# Altium footprint library OSHW_LuxonisMaster_20201223.PcbLib: 112 footprints (part 7 of 7)
Each footprint in its own frame and in the unit in brackets; x right, y up, seen from the top. Pads: shape width x height; smd on the part's side, far side on the other; paste and mask are expansions set on the pad; w line width, h text height; cw(c..) or ccw(c..) is an arc to the next point about the centre after c.
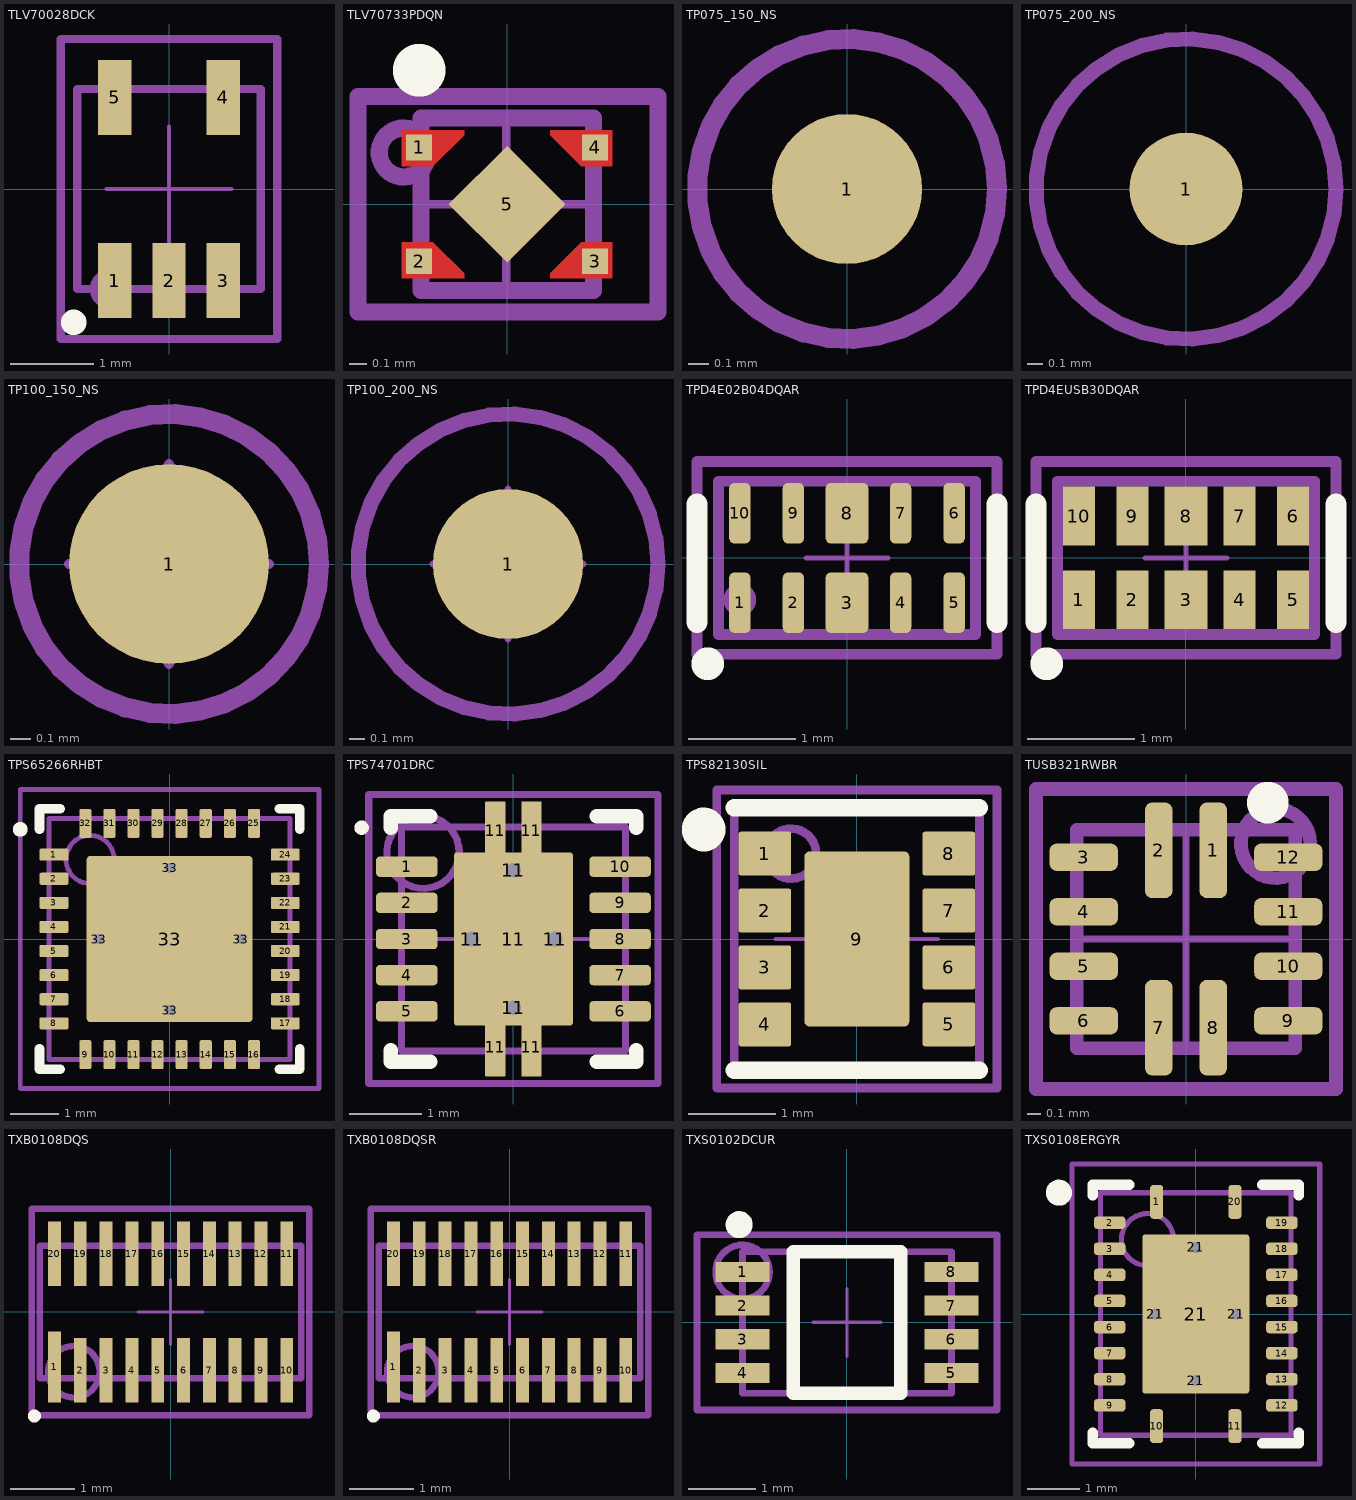
[diagram p6: the footprints below, top view; thin cyan lines are the x and y axes]

## TLV70028DCK [mm] "SC70-5 1.1mm"
height 1.1
pads (5):
  rect 0.4x0.9 smd paste-0.025 mask+0.05: 1(-0.65,-1.1) 2(0,-1.1) 3(0.65,-1.1) 4(0.65,1.1) 5(-0.65,1.1)
Top Overlay:
  circle w0.254: c-1.143,-1.6 r0.025
Top Assembly:
  circle w0.1: c-0.7,-1.2 r0.2
  lines w0.1: -1.3,-1.8 -1.3,1.8 1.3,1.8 1.3,-1.8 -1.3,-1.8
  text "'.Designator'" at 0,0 h1
Top Courtyard:
  lines w0.05: -0.75,0 0,0 ; 0,-0.75 0,0 ; 0,0.75 0,0 ; 0.75,0 0,0 ; -1.3,-1.8 1.3,-1.8 1.3,1.8 -1.3,1.8 -1.3,-1.8
Top Component Outline:
  lines w0.1: -1.1,-1.2 1.1,-1.2 1.1,1.2 -1.1,1.2 -1.1,-1.2
3D body "User Library-SOT353-1.step": height 1.1, standoff 0, extent -1.1,-1.2 1.1,1.2

## TLV70733PDQN [mm] "DFN, 4-Leads, Body 1.00x1.00mm, Pitch 0.65mm, IPC High Density"
height 0.4
pads (5):
  rect 0.15x0.15 smd mask+0: 1(-0.51,0.33) 2(-0.51,-0.33) 3(0.51,-0.33)
  rect 0.15x0.15 smd paste+0 mask+0: 4(0.51,0.33)
  rect 0.48x0.48 smd rot 45 mask+0.05: 5(0,0)
Top Layer:
  region: 0.036,0.777
  region: 0.25,0.43 0.61,0.43 0.61,0.22 0.43,0.22 0.25,0.4
  region: -0.25,-0.43 -0.61,-0.43 -0.61,-0.22 -0.43,-0.22 -0.25,-0.4
  region: -0.25,0.43 -0.61,0.43 -0.61,0.22 -0.43,0.22 -0.25,0.4
  region: 0.25,-0.43 0.61,-0.43 0.61,-0.22 0.43,-0.22 0.25,-0.4
Top Overlay:
  circle w0.254: c-0.51,0.777 r0.025
Top Paste:
  region: 0.25,0.43 0.61,0.43 0.61,0.22 0.43,0.22 0.25,0.4
  region: -0.25,-0.43 -0.61,-0.43 -0.61,-0.22 -0.43,-0.22 -0.25,-0.4
  region: -0.25,0.43 -0.61,0.43 -0.61,0.22 -0.43,0.22 -0.25,0.4
  region: 0.25,-0.43 0.61,-0.43 0.61,-0.22 0.43,-0.22 0.25,-0.4
Top Assembly:
  circle w0.1: c-0.6,0.3 r0.141
  lines w0.1: -0.865,-0.625 0.874,-0.625 0.874,0.625 -0.865,0.625 -0.865,-0.625
  text "'.Designator'" at 0,0 h1
Top Courtyard:
  lines w0.05: -0.505,0 0.495,0 ; -0.005,-0.5 -0.005,0.5 ; -0.865,-0.625 -0.865,0.625 0.874,0.625 0.874,-0.625 -0.865,-0.625
Top Component Outline:
  lines w0.1: -0.5,-0.5 -0.5,0.5 0.5,0.5 0.5,-0.5 -0.5,-0.5
3D body "DQN0004A.stp": height 0.34, standoff -0.02, extent -0.5,-0.5 0.5,0.5

## TP075_150_NS [mm] "0.75mm dia pad, 1.5mm dia clearance, no silk screen"
pads (1):
  round 0.75 smd paste-2: 1(0,0)
Top Assembly:
  circle w0.1: c0,0 r0.75
  text "'.Designator'" at 0,0 h0.75
Top Courtyard:
  circle w0.05: c0,0 r0.75

## TP075_200_NS [mm] "0.75mm dia pad, 2mm dia clearance, no silk screen"
pads (1):
  round 0.75 smd paste-2: 1(0,0)
Top Assembly:
  circle w0.1: c0,0 r1
  text "'.Designator'" at 0,0 h0.75
Top Courtyard:
  circle w0.05: c0,0 r1

## TP100_150_NS [mm] "1mm dia pad, 1.5mm clearance, no silk screen"
pads (1):
  round 1 smd paste-2: 1(0,0)
Top Assembly:
  circle w0.1: c0,0 r0.75
  text "'.Designator'" at 0,0 h0.75
Top Courtyard:
  circle w0.05: c0,0 r0.75
  lines w0.05: -0.5,0 0.5,0 ; 0,-0.5 0,0.5

## TP100_200_NS [mm] "1mm dia pad, 2mm dia clearance, no silk screen"
pads (1):
  round 1 smd paste-2: 1(0,0)
Top Assembly:
  circle w0.1: c0,0 r1
  text "'.Designator'" at 0,0 h0.75
Top Courtyard:
  circle w0.05: c0,0 r1
  lines w0.05: -0.5,0 0.5,0 ; 0,-0.5 0,0.5

## TPD4E02B04DQAR [mm] "TPD4E02B04DQAR"
height 0.55
pads (10):
  rrect50% 0.2x0.565 smd mask+0.07: 1(-1,-0.417) 2(-0.5,-0.417) 4(0.5,-0.417) 5(1,-0.417) 6(1,0.417) 7(0.5,0.417) 9(-0.5,0.417) 10(-1,0.417)
  rrect25% 0.4x0.565 smd mask+0.07: 3(0,-0.417) 8(0,0.417)
Top Overlay:
  circle w0.254: c-1.3,-0.988 r0.025
  lines w0.2: -1.4,-0.6 -1.4,0.5 ; 1.4,-0.6 1.4,0.5
Top Assembly:
  circle w0.254: c-1,-0.39 r0.025
  lines w0.1: -1.4,-0.9 -1.4,0.9 1.4,0.9 1.4,-0.9 -1.4,-0.9
  text "'.Designator'" at 0,0 h1
Top Courtyard:
  lines w0.05: -0.381,0 0.381,0 ; 0,-0.381 0,0.381 ; -1.4,-0.9 -1.4,0.9 1.4,0.9 1.4,-0.9 -1.4,-0.9
Top Component Outline:
  lines w0.1: -1.2,-0.715 -1.2,0.715 1.2,0.715 1.2,-0.715 -1.2,-0.715
3D body: height 0.55, standoff 0, extent -1.2,-0.715 1.2,0.715

## TPD4EUSB30DQAR [mm] "TPD4EUSB30DQAR"
height 0.55
pads (10):
  rect 0.3x0.55 smd mask+0.05: 1(-1,-0.39) 2(-0.5,-0.39) 4(0.5,-0.39) 5(1,-0.39) 6(1,0.39) 7(0.5,0.39) 9(-0.5,0.39) 10(-1,0.39)
  rect 0.4x0.55 smd mask+0.05: 3(0,-0.39) 8(0,0.39)
Top Overlay:
  circle w0.254: c-1.3,-0.988 r0.025
  lines w0.2: -1.4,-0.6 -1.4,0.5 ; 1.4,-0.6 1.4,0.5
Top Assembly:
  circle w0.254: c-1,-0.39 r0.025
  lines w0.1: -1.4,-0.9 1.4,-0.9 1.4,0.9 -1.4,0.9 -1.4,-0.9
  text "'.Designator'" at 0,0 h1
Top Courtyard:
  lines w0.05: -0.381,0 0.381,0 ; 0,-0.381 0,0.381 ; -1.4,-0.9 1.4,-0.9 1.4,0.9 -1.4,0.9 -1.4,-0.9
Top Component Outline:
  lines w0.1: -1.2,-0.715 1.2,-0.715 1.2,0.715 -1.2,0.715 -1.2,-0.715
3D body: height 0.55, standoff 0, extent -1.2,-0.715 1.2,0.715

## TPS65266RHBT [mm] "QFN, 32-Leads, Body 5.00x5.00mm, Pitch 0.50mm, Thermal Pad 3.45x3.45mm, IPC Medium Density"
height 1
pads (37):
  rrect25% 0.6x0.25 smd mask+0.07: 1(-2.4,1.75) 2(-2.4,1.25) 3(-2.4,0.75) 4(-2.4,0.25) 5(-2.4,-0.25) 6(-2.4,-0.75) 7(-2.4,-1.25) 8(-2.4,-1.75) 17(2.4,-1.75) 18(2.4,-1.25) 19(2.4,-0.75) 20(2.4,-0.25) 21(2.4,0.25) 22(2.4,0.75) 23(2.4,1.25) 24(2.4,1.75)
  rrect25% 0.25x0.6 smd mask+0.07: 9(-1.75,-2.4) 10(-1.25,-2.4) 11(-0.75,-2.4) 12(-0.25,-2.4) 13(0.25,-2.4) 14(0.75,-2.4) 15(1.25,-2.4) 16(1.75,-2.4) 25(1.75,2.4) 26(1.25,2.4) 27(0.75,2.4) 28(0.25,2.4) 29(-0.25,2.4) 30(-0.75,2.4) 31(-1.25,2.4) 32(-1.75,2.4)
  round 0.406 hole 0.203: 33(-1.475,0) 33(0,-1.475) 33(0,1.475) 33(1.475,0)
  rrect5% 3.45x3.45 smd paste-10 mask+0.07: 33(0,0)
Top Overlay:
  circle w0.254: c-3.1,2.275 r0.025
  lines w0.2: -2.7,-2.275 -2.7,-2.7 -2.275,-2.7 ; -2.7,2.275 -2.7,2.7 -2.275,2.7 ; 2.275,-2.7 2.7,-2.7 2.7,-2.275 ; 2.275,2.7 2.7,2.7 2.7,2.275
Top Paste:
  rectangle: 0.1,0.1 1.59,1.59
  rectangle: -1.59,0.1 -0.1,1.59
  rectangle: -1.59,-1.59 -0.1,-0.1
  rectangle: 0.1,-1.6 1.59,-0.11
Top Assembly:
  circle w0.1: c-1.65,1.65 r0.5
  lines w0.1: -3.1,-3.1 3.1,-3.1 3.1,3.1 -3.1,3.1 -3.1,-3.1
  text "'.Designator'" at 0,0 h1
Top Courtyard:
  lines w0.05: -0.5,0 0.5,0 ; 0,-0.5 0,0.5 ; -3.1,-3.1 -3.1,3.1 3.1,3.1 3.1,-3.1 -3.1,-3.1
Top Component Outline:
  lines w0.1: -2.5,-2.5 2.5,-2.5 2.5,2.5 -2.5,2.5 -2.5,-2.5
3D body "RHB0032E.stp": height 1, standoff 0, extent -2.5,-2.5 2.5,2.5

## TPS74701DRC [mm] "SON, 10-Leads, Body 3x3mm, Pitch 0.5mm, Thermal Pad 2.4x1.65mm, TI Recommended"
height 1
pads (19):
  rrect36% 0.85x0.28 smd paste-0.025 mask+0.07: 1(-1.475,1) 2(-1.475,0.5) 3(-1.475,0) 4(-1.475,-0.5) 5(-1.475,-1) 6(1.475,-1) 7(1.475,-0.5) 8(1.475,0) 9(1.475,0.5) 10(1.475,1)
  round 0.406 hole 0.203: 11(-0.575,0) 11(0,-0.95) 11(0,0.95) 11(0.575,0)
  rrect6% 0.28x0.8 smd paste-1 mask+0.07: 11(-0.25,-1.5) 11(-0.25,1.5) 11(0.25,-1.5) 11(0.25,1.5)
  rrect6% 1.65x2.4 smd paste-0.825 mask+0.07: 11(0,0)
Top Overlay:
  circle w0.1: c-2.1,1.54 r0.05
  lines w0.2: -1.7,-1.54 -1.7,-1.7 -1.15,-1.7 ; -1.7,1.54 -1.7,1.7 -1.15,1.7 ; 1.15,-1.7 1.7,-1.7 1.7,-1.54 ; 1.15,1.7 1.7,1.7 1.7,1.54
Top Paste:
  rectangle: -0.79,0.11 -0.11,1.16
  rectangle: -0.38,1.38 -0.12,1.88
  region: 0.38,1.88 0.12,1.88 0.12,1.38 0.38,1.38
  region: 0.38,-1.38 0.12,-1.38 0.12,-1.88 0.38,-1.88
  rectangle: -0.38,-1.88 -0.12,-1.38
  region: 0.79,1.16 0.11,1.16 0.11,0.11 0.79,0.11
  region: 0.79,-0.11 0.11,-0.11 0.11,-1.16 0.79,-1.16
  rectangle: -0.79,-1.16 -0.11,-0.11
Top Assembly:
  circle w0.1: c-1.25,1.2 r0.5
  lines w0.1: -2,-2 -2,2 2,2 2,-2 -2,-2
  text ".Designator" at 0,0 h0.64
Top Courtyard:
  lines w0.05: -1.05,0 1.05,0 ; 0,-1.05 0,1.05 ; -2,-2 2,-2 2,2 -2,2 -2,-2
Top Component Outline:
  lines w0.1: -1.55,-1.55 -1.55,1.55 1.55,1.55 1.55,-1.55 -1.55,-1.55
3D body: height 1, standoff 0, extent -1.55,-1.55 1.55,1.55

## TPS82130SIL [mm] "Non-Isolated PoL Module DC DC Converter 1 Output 0.9 ~ 5V    3A 3V - 17V Input"
height 1.53
pads (9):
  rrect10% 0.6x0.5 smd paste-0.05 mask-0.05: 1(-1.05,0.975) 2(-1.05,0.325) 3(-1.05,-0.325) 4(-1.05,-0.975) 5(1.05,-0.975) 6(1.05,-0.325) 7(1.05,0.325) 8(1.05,0.975)
  rrect10% 1.2x2 smd paste-2 mask-0.05: 9(0,0)
Top Overlay:
  circle w0.35: c-1.75,1.25 r0.075
  lines w0.2: -1.4,-1.5 1.4,-1.5 ; -1.4,1.5 1.4,1.5
Top Paste:
  region: 0.5,-0.825 0.5,-0.845 0.485,-0.882 0.457,-0.91 0.42,-0.925 0.4,-0.925 -0.4,-0.925 -0.42,-0.925 -0.457,-0.91 -0.485,-0.882 -0.5,-0.845 -0.5,-0.825 -0.5,-0.225 -0.5,-0.205 -0.485,-0.168 -0.457,-0.14 -0.42,-0.125 -0.4,-0.125 0.4,-0.125 0.42,-0.125 0.457,-0.14 0.485,-0.168 0.5,-0.205 0.5,-0.225
  region: -0.5,0.825 -0.5,0.845 -0.485,0.882 -0.457,0.91 -0.42,0.925 -0.4,0.925 0.4,0.925 0.42,0.925 0.457,0.91 0.485,0.882 0.5,0.845 0.5,0.825 0.5,0.225 0.5,0.205 0.485,0.168 0.457,0.14 0.42,0.125 0.4,0.125 -0.4,0.125 -0.42,0.125 -0.457,0.14 -0.485,0.168 -0.5,0.205 -0.5,0.225
Top Assembly:
  circle w0.1: c-0.75,0.975 r0.285
  lines w0.1: -1.6,-1.7 1.6,-1.7 1.6,1.7 -1.6,1.7 -1.6,-1.7
  text "'.Designator'" at 0,0.188 h1
Top Courtyard:
  lines w0.05: -0.925,0 0,0 ; 0,-0.925 0,0 ; 0,0.925 0,0 ; 0.925,0 0,0 ; -1.6,-1.7 -1.6,1.7 1.6,1.7 1.6,-1.7 -1.6,-1.7
Top Component Outline:
  lines w0.1: -1.4,-1.5 1.4,-1.5 1.4,1.5 -1.4,1.5 -1.4,-1.5
3D body "TPS82130SILR--3DModel-STEP-56544.STEP": height 1.55, standoff 0.02, extent -1.4,-1.5 1.4,1.5

## TUSB321RWBR [mm] "X2QFN-12 1.6x1.6"
height 0.4
pads (12):
  rrect50% 0.2x0.7 smd mask+0.05: 1(0.2,0.65) 2(-0.2,0.65) 7(-0.2,-0.65) 8(0.2,-0.65)
  rrect50% 0.5x0.2 smd mask+0.05: 3(-0.75,0.6) 4(-0.75,0.2) 5(-0.75,-0.2) 6(-0.75,-0.6) 9(0.75,-0.6) 10(0.75,-0.2) 11(0.75,0.2) 12(0.75,0.6)
Top Overlay:
  circle w0.254: c0.6,1 r0.025
Top Assembly:
  circle w0.1: c0.657,0.7 r0.254
  lines w0.1: -1.1,-1.1 1.1,-1.1 1.1,1.1 -1.1,1.1 -1.1,-1.1
  text "'.Designator'" at 0,0 h1
Top Courtyard:
  lines w0.05: -0.8,0 0,0 ; 0,-0.8 0,0 ; 0,0.8 0,0 ; 0.8,0 0,0 ; -1.1,-1.1 1.1,-1.1 1.1,1.1 -1.1,1.1 -1.1,-1.1
Top Component Outline:
  lines w0.1: -0.8,-0.8 -0.8,0.8 0.8,0.8 0.8,-0.8 -0.8,-0.8
3D body: height 0.4, standoff 0, extent -0.8,-0.8 0.8,0.8

## TXB0108DQS [mm] "SON, 20-Leads, Body 4.00x2.00mm, Pitch 0.40mm, IPC High Density"
height 0.55
pads (20):
  rect 0.2x1.1 smd mask+0.05: 1(-1.8,-0.85)
  rect 0.2x1 smd mask+0.05: 2(-1.4,-0.9) 3(-1,-0.9) 4(-0.6,-0.9) 5(-0.2,-0.9) 6(0.2,-0.9) 7(0.6,-0.9) 8(1,-0.9) 9(1.4,-0.9) 10(1.8,-0.9) 11(1.8,0.9) 12(1.4,0.9) 13(1,0.9) 14(0.6,0.9) 15(0.2,0.9) 16(-0.2,0.9) 17(-0.6,0.9) 18(-1,0.9) 19(-1.4,0.9) 20(-1.8,0.9)
Top Overlay:
  circle w0.1: c-2.112,-1.612 r0.05
Top Assembly:
  circle w0.1: c-1.5,-0.926 r0.4
  lines w0.1: -2.15,-1.6 -2.15,1.6 2.15,1.6 2.15,-1.6 -2.15,-1.6
  text "'.Designator'" at 0,0 h1
Top Courtyard:
  lines w0.05: -0.5,0 0.5,0 ; 0,-0.5 0,0.5 ; -2.15,-1.6 -2.15,1.6 2.15,1.6 2.15,-1.6 -2.15,-1.6
Top Component Outline:
  lines w0.1: -2.025,-1.025 2.025,-1.025 2.025,1.025 -2.025,1.025 -2.025,-1.025
3D body: height 0.55, standoff 0.05, extent -2.025,-1.025 2.025,1.025

## TXB0108DQSR [mm] "SON, 20-Leads, Body 4.00x2.00mm, Pitch 0.40mm, IPC High Density"
height 0.55
pads (20):
  rect 0.2x1.1 smd mask+0.05: 1(-1.8,-0.85)
  rect 0.2x1 smd mask+0.05: 2(-1.4,-0.9) 3(-1,-0.9) 4(-0.6,-0.9) 5(-0.2,-0.9) 6(0.2,-0.9) 7(0.6,-0.9) 8(1,-0.9) 9(1.4,-0.9) 10(1.8,-0.9) 11(1.8,0.9) 12(1.4,0.9) 13(1,0.9) 14(0.6,0.9) 15(0.2,0.9) 16(-0.2,0.9) 17(-0.6,0.9) 18(-1,0.9) 19(-1.4,0.9) 20(-1.8,0.9)
Top Overlay:
  circle w0.1: c-2.112,-1.612 r0.05
Top Assembly:
  circle w0.1: c-1.5,-0.926 r0.4
  lines w0.1: -2.15,-1.6 -2.15,1.6 2.15,1.6 2.15,-1.6 -2.15,-1.6
  text "'.Designator'" at 0,0 h1
Top Courtyard:
  lines w0.05: -0.5,0 0.5,0 ; 0,-0.5 0,0.5 ; -2.15,-1.6 -2.15,1.6 2.15,1.6 2.15,-1.6 -2.15,-1.6
Top Component Outline:
  lines w0.1: -2.025,-1.025 2.025,-1.025 2.025,1.025 -2.025,1.025 -2.025,-1.025
3D body: height 0.55, standoff 0.05, extent -2.025,-1.025 2.025,1.025

## TXS0102DCUR [mm] "TSSOP, 8-Leads, Body 2.00x2.30mm, Pitch 0.50mm"
height 0.9
pads (8):
  rect 0.8x0.3 smd mask+0.05: 1(-1.55,0.75) 2(-1.55,0.25) 3(-1.55,-0.25) 4(-1.55,-0.75) 5(1.55,-0.75) 6(1.55,-0.25) 7(1.55,0.25) 8(1.55,0.75)
Top Overlay:
  circle w0.2: c-1.6,1.45 r0.1
  lines w0.2: -0.8,-1.05 0.8,-1.05 0.8,1.05 -0.8,1.05 -0.8,-1.05
Top Assembly:
  circle w0.1: c-1.55,0.75 r0.4
  lines w0.1: -2.225,-1.3 -2.225,1.3 2.225,1.3 2.225,-1.3 -2.225,-1.3
  text "'.Designator'" at 0,0.188 h1
Top Courtyard:
  lines w0.05: -0.5,0 0.5,0 ; 0,-0.5 0,0.5 ; -2.225,-1.3 2.225,-1.3 2.225,1.3 -2.225,1.3 -2.225,-1.3
Top Component Outline:
  lines w0.1: -1.549,-1.05 -1.549,1.05 1.549,1.05 1.549,-1.05 -1.549,-1.05
3D body "TSSOP50P310X90-8N.step": height 0.9, standoff 0, extent -1.549,-1.05 1.549,1.05

## TXS0108ERGYR [mm] "20-VQFN (3.5x4.5)"
height 1
pads (25):
  rrect50% 0.25x0.65 smd mask+0.07: 1(-0.75,2.15) 10(-0.75,-2.15) 11(0.75,-2.15) 20(0.75,2.15)
  rrect50% 0.6x0.24 smd mask+0.07: 2(-1.65,1.75) 3(-1.65,1.25) 4(-1.65,0.75) 5(-1.65,0.25) 6(-1.65,-0.25) 7(-1.65,-0.75) 8(-1.65,-1.25) 9(-1.65,-1.75) 12(1.65,-1.75) 13(1.65,-1.25) 14(1.65,-0.75) 15(1.65,-0.25) 16(1.65,0.25) 17(1.65,0.75) 18(1.65,1.25) 19(1.65,1.75)
  oval 0.406x0.406 hole 0.203: 21(-0.775,0) 21(0,-1.275) 21(0,1.275) 21(0.775,0)
  rrect5% 2.05x3.05 smd paste-3 mask+0.07: 21(0,0)
Top Overlay:
  circle w0.25: c-2.625,2.325 r0.125
  lines w0.2: -1.975,-2.275 -1.975,-2.475 -1.275,-2.475 ; -1.975,2.275 -1.975,2.475 -1.275,2.475 ; 1.275,-2.475 1.975,-2.475 1.975,-2.275 ; 1.275,2.475 1.975,2.475 1.975,2.275
Top Paste:
  region: -0.1,-0.105 -1.02,-0.105 -1.02,-1.435 -0.1,-1.435
  rectangle: 0.1,-1.435 1.02,-0.105
  region: -0.1,1.435 -1.02,1.435 -1.02,0.105 -0.1,0.105
  rectangle: 0.1,0.105 1.02,1.435
Top Assembly:
  circle w0.1: c-0.925,1.425 r0.5
  lines w0.1: -2.375,-2.875 2.375,-2.875 2.375,2.875 -2.375,2.875 -2.375,-2.875
  text "'.Designator'" at 0,0.188 h1
Top Courtyard:
  lines w0.05: -0.5,0 0.5,0 ; 0,-0.5 0,0.5 ; -2.375,-2.875 2.375,-2.875 2.375,2.875 -2.375,2.875 -2.375,-2.875
Top Component Outline:
  lines w0.1: -1.825,-2.325 1.825,-2.325 1.825,2.325 -1.825,2.325 -1.825,-2.325
3D body "QFN50P350X450X100_HS-21N.step": height 1, standoff 0, extent -1.826,-2.326 1.826,2.326